# Altium footprint library 6-Connectors-2.PcbLib: 57 footprints (part 7 of 7)
Each footprint in its own frame and in the unit in brackets; x right, y up, seen from the top. Pads: shape width x height; smd on the part's side, far side on the other; paste and mask are expansions set on the pad; w line width, h text height; cw(c..) or ccw(c..) is an arc to the next point about the centre after c.
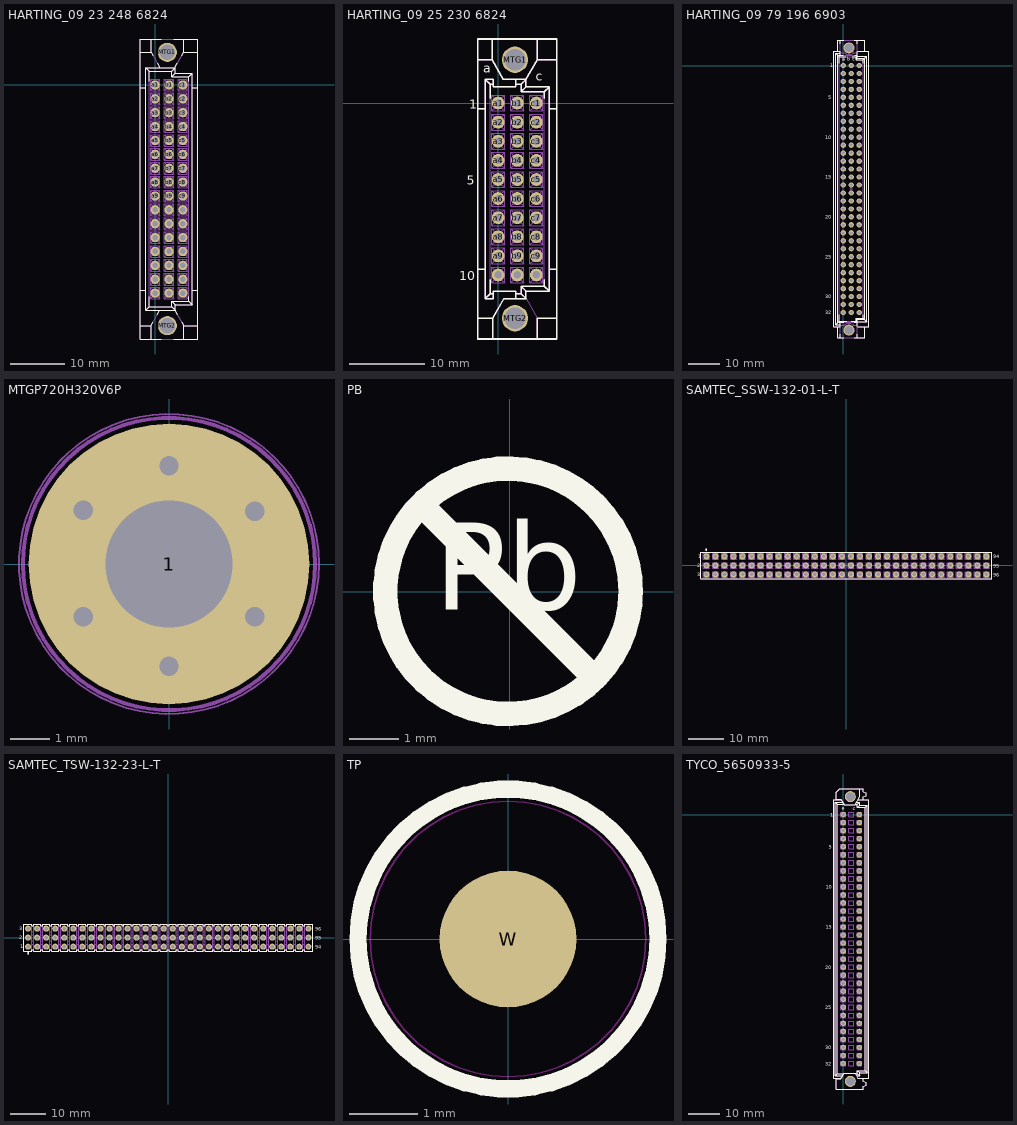
[diagram p6: the footprints below, top view; thin cyan lines are the x and y axes]

## HARTING_09 23 248 6824 [mm] "DIN 41612, Type 2C, Thru-Hole;  Rows a+b+c, 48 Position, Performance level 2, Lead 2.9 mm, Pitch 2.54mm, Vertical Female Connector"
height 11.6
pads (50):
  round 1.7 hole 1: a1(0,0) a2(0,-2.54) a3(0,-5.08) a4(0,-7.62) a5(0,-10.16) a6(0,-12.7) a7(0,-15.24) a8(0,-17.78) a9(0,-20.32) a10(0,-22.86) a11(0,-25.4) a12(0,-27.94) a13(0,-30.48) a14(0,-33.02) a15(0,-35.56) a16(0,-38.1) b1(2.54,0) b2(2.54,-2.54) b3(2.54,-5.08) b4(2.54,-7.62) b5(2.54,-10.16) b6(2.54,-12.7) b7(2.54,-15.24) b8(2.54,-17.78) b9(2.54,-20.32) b10(2.54,-22.86) b11(2.54,-25.4) b12(2.54,-27.94) b13(2.54,-30.48) b14(2.54,-33.02) b15(2.54,-35.56) b16(2.54,-38.1) c1(5.08,0) c2(5.08,-2.54) c3(5.08,-5.08) c4(5.08,-7.62) c5(5.08,-10.16) c6(5.08,-12.7) c7(5.08,-15.24) c8(5.08,-17.78) c9(5.08,-20.32) c10(5.08,-22.86) c11(5.08,-25.4) c12(5.08,-27.94) c13(5.08,-30.48) c14(5.08,-33.02) c15(5.08,-35.56) c16(5.08,-38.1)
  round 3.5 / inner round 3.5 / far side round 5.1 hole 2.8: MTG1(2.24,5.95) MTG2(2.24,-44.05)
Top Overlay:
  lines w0.2: -2.71,-44.05 -0.735,-44.05 ; -2.71,-37.55 -1.71,-37.55 ; -2.71,-0.55 -1.71,-0.55 ; -2.71,5.95 -0.735,5.95 ; -1.06,-38.763 -1.06,-40.6 ; -1.06,0.662 -1.06,2.5 ; -0.735,-46.5 -0.735,-44.05 ; -0.735,8.4 -0.735,5.95 ; -0.395,-43.461 -0.735,-44.05 ; -0.395,5.361 -0.735,5.95 ; 0.412,-42.063 0.882,-41.25 ; 0.412,3.962 0.882,3.15 ; 1.105,-46.5 -2.71,-46.5 -2.71,8.4 1.105,8.4 ; 3.375,-46.5 7.79,-46.5 7.79,8.4 3.375,8.4 ; 3.598,-41.25 4.068,-42.063 ; 3.598,3.15 4.068,3.962 ; 4.875,-43.461 5.215,-44.05 ; 4.875,5.361 5.215,5.95 ; 5.215,-46.5 5.215,-44.05 ; 5.215,8.4 5.215,5.95 ; 6.14,-38.763 6.14,-39.55 ; 6.14,0.662 6.14,1.45 ; 6.79,-37.55 7.79,-37.55 ; 6.79,-0.55 7.79,-0.55 ; 7.79,-44.05 5.215,-44.05 ; 7.79,5.95 5.215,5.95 ; -1.71,-41.25 -1.06,-40.6 ; -1.71,-41.25 3.69,-41.25 ; -1.71,-41.25 -1.71,3.15 ; -1.71,3.15 -1.06,2.5 ; -1.71,3.15 3.69,3.15 ; -1.06,-40.6 3.04,-40.6 ; -1.06,2.5 3.04,2.5 ; 3.04,-40.6 3.04,-39.55 ; 3.04,-40.6 3.69,-41.25 ; 3.04,-39.55 6.14,-39.55 ; 3.04,-39.55 3.69,-40.2 ; 3.04,1.45 3.04,2.5 ; 3.04,1.45 3.69,2.1 ; 3.04,1.45 6.14,1.45 ; 3.04,2.5 3.69,3.15 ; 3.69,-41.25 3.69,-40.2 ; 3.69,-40.2 6.79,-40.2 ; 3.69,2.1 6.79,2.1 ; 3.69,2.1 3.69,3.15 ; 6.14,-39.55 6.79,-40.2 ; 6.14,1.45 6.79,2.1 ; 6.79,-40.2 6.79,2.1
Mechanical 8:
  lines w0.1: -0.5,-38.1 0,-38.1 ; -0.5,0 0,0 ; 0,-38.6 0,-38.1 ; 0,-37.6 0,-38.1 ; 0,-0.5 0,0 ; 0,0.5 0,0 ; 0.5,-38.1 0,-38.1 ; 0.5,0 0,0 ; 1.74,-44.05 2.24,-44.05 ; 1.74,5.95 2.24,5.95 ; 2.04,-38.1 2.54,-38.1 ; 2.04,0 2.54,0 ; 2.24,-44.55 2.24,-44.05 ; 2.24,-43.55 2.24,-44.05 ; 2.24,5.45 2.24,5.95 ; 2.24,6.45 2.24,5.95 ; 2.54,-38.6 2.54,-38.1 ; 2.54,-37.6 2.54,-38.1 ; 2.54,-0.5 2.54,0 ; 2.54,0.5 2.54,0 ; 2.74,-44.05 2.24,-44.05 ; 2.74,5.95 2.24,5.95 ; 3.04,-38.1 2.54,-38.1 ; 3.04,0 2.54,0 ; 4.58,-38.1 5.08,-38.1 ; 4.58,0 5.08,0 ; 5.08,-38.6 5.08,-38.1 ; 5.08,-37.6 5.08,-38.1 ; 5.08,-0.5 5.08,0 ; 5.08,0.5 5.08,0 ; 5.58,-38.1 5.08,-38.1 ; 5.58,0 5.08,0
Mechanical 14:
  drawing of 670 lines, arcs and shapes, not listed
3D body "HARTING_09 23 248 6824.stp": height 11.6, standoff -4.5, extent -2.71,-46.5 7.79,8.4

## HARTING_09 25 230 6824 [mm] "DIN 41612, Type 3C, Thru-Hole;  Rows a+b+c, 30 Positions, Performance level 2, Lead 2.9 mm, Pitch 2.54mm, Vertical Female Connector"
height 11.6
pads (32):
  round 1.7 hole 1: a1(0,0) a2(0,-2.54) a3(0,-5.08) a4(0,-7.62) a5(0,-10.16) a6(0,-12.7) a7(0,-15.24) a8(0,-17.78) a9(0,-20.32) a10(0,-22.86) b1(2.54,0) b2(2.54,-2.54) b3(2.54,-5.08) b4(2.54,-7.62) b5(2.54,-10.16) b6(2.54,-12.7) b7(2.54,-15.24) b8(2.54,-17.78) b9(2.54,-20.32) b10(2.54,-22.86) c1(5.08,0) c2(5.08,-2.54) c3(5.08,-5.08) c4(5.08,-7.62) c5(5.08,-10.16) c6(5.08,-12.7) c7(5.08,-15.24) c8(5.08,-17.78) c9(5.08,-20.32) c10(5.08,-22.86)
  round 3.5 / inner round 3.5 / far side round 5.1 hole 2.8: MTG1(2.24,5.76) MTG2(2.24,-28.62)
Top Overlay:
  lines w0.2: -2.71,-28.62 -0.735,-28.62 ; -2.71,-22.12 -1.71,-22.12 ; -2.71,-0.74 -1.71,-0.74 ; -2.71,5.76 -0.81,5.76 ; -1.06,-23.523 -1.06,-25.355 ; -1.06,0.662 -1.06,2.495 ; -0.81,8.52 -0.81,5.76 ; -0.735,-31.38 -0.735,-28.62 ; -0.66,-25.355 -1.06,-25.355 ; -0.66,2.495 -1.06,2.495 ; 2.34,-26.005 2.34,-25.005 -0.66,-25.005 -0.66,-26.005 -1.71,-26.005 ; 2.34,-25.355 3.04,-25.355 ; 2.34,2.495 3.04,2.495 ; 2.34,3.145 2.34,2.145 -0.66,2.145 -0.66,3.145 -1.71,3.145 ; 3.705,-26.005 0.775,-26.005 -0.735,-28.62 ; 5.19,8.52 5.19,5.76 ; 5.215,-31.38 5.215,-28.62 7.79,-28.62 ; 6.14,-23.523 6.14,-24.355 ; 6.14,0.662 6.14,1.495 ; 6.79,-22.12 7.79,-22.12 ; 6.79,-0.74 7.79,-0.74 ; 7.79,5.76 5.19,5.76 ; -1.71,-26.005 -1.71,3.145 ; -1.71,-26.005 -1.06,-25.355 ; -1.71,3.145 -1.06,2.495 ; -0.81,5.76 0.7,3.145 3.69,3.145 ; 3.04,-25.355 3.04,-24.355 ; 3.04,-25.355 3.69,-26.005 3.69,-25.005 ; 3.04,-24.355 6.14,-24.355 ; 3.04,-24.355 3.69,-25.005 ; 3.04,1.495 3.04,2.495 ; 3.04,1.495 6.14,1.495 ; 3.04,1.495 3.69,2.145 ; 3.04,2.495 3.69,3.145 ; 3.69,-25.005 6.79,-25.005 ; 3.69,2.145 6.79,2.145 ; 3.69,2.145 3.69,3.145 ; 3.69,3.145 5.19,5.76 ; 6.14,-24.355 6.79,-25.005 ; 6.14,1.495 6.79,2.145 ; 6.79,-25.005 6.79,2.145 ; -2.71,-31.38 7.79,-31.38 7.79,8.52 -2.71,8.52 -2.71,-31.38
  text "c" at 4.975,2.95 h1.2
  text "10" at -5.172,-23.535 h1.2
  text "5" at -4.174,-10.885 h1.2
  text "1" at -3.839,-0.725 h1.2
  text "a" at -2,4 h1.2
Mechanical 8:
  lines w0.1: -0.5,-22.86 0,-22.86 ; -0.5,0 0,0 ; 0,-23.36 0,-22.86 ; 0,-22.36 0,-22.86 ; 0,-0.5 0,0 ; 0,0.5 0,0 ; 0.5,-22.86 0,-22.86 ; 0.5,0 0,0 ; 1.74,-28.62 2.24,-28.62 ; 1.74,5.76 2.24,5.76 ; 2.04,-22.86 2.54,-22.86 ; 2.04,0 2.54,0 ; 2.24,-29.12 2.24,-28.62 ; 2.24,-28.12 2.24,-28.62 ; 2.24,5.26 2.24,5.76 ; 2.24,6.26 2.24,5.76 ; 2.54,-23.36 2.54,-22.86 ; 2.54,-22.36 2.54,-22.86 ; 2.54,-0.5 2.54,0 ; 2.54,0.5 2.54,0 ; 2.74,-28.62 2.24,-28.62 ; 2.74,5.76 2.24,5.76 ; 3.04,-22.86 2.54,-22.86 ; 3.04,0 2.54,0 ; 4.58,-22.86 5.08,-22.86 ; 4.58,0 5.08,0 ; 5.08,-23.36 5.08,-22.86 ; 5.08,-22.36 5.08,-22.86 ; 5.08,-0.5 5.08,0 ; 5.08,0.5 5.08,0 ; 5.58,-22.86 5.08,-22.86 ; 5.58,0 5.08,0
Mechanical 14:
  drawing of 422 lines, arcs and shapes, not listed
  text "c" at 4.975,2.95 h1.2
  text "a" at -2,4 h1.2
  text "10" at -5.172,-23.535 h1.2
  text "1" at -3.839,-0.725 h1.2
  text "5" at -4.174,-10.885 h1.2
3D body "HARTING_09 25 230 6824.stp": height 11.6, standoff -2.9, extent -2.71,-31.38 7.79,8.52

## HARTING_09 79 196 6903 [mm] "DIN 41612, Type RL, 96 Position, Rows a+b+c, Performance level 2, Straight Male Connector, Lead 4.0 mm, Pitch 2.54mm"
height 11.6
pads (98):
  round 1.7 hole 1: a1(0,0) a2(0,-2.54) a3(0,-5.08) a4(0,-7.62) a5(0,-10.16) a6(0,-12.7) a7(0,-15.24) a8(0,-17.78) a9(0,-20.32) a10(0,-22.86) a11(0,-25.4) a12(0,-27.94) a13(0,-30.48) a14(0,-33.02) a15(0,-35.56) a16(0,-38.1) a17(0,-40.64) a18(0,-43.18) a19(0,-45.72) a20(0,-48.26) a21(0,-50.8) a22(0,-53.34) a23(0,-55.88) a24(0,-58.42) a25(0,-60.96) a26(0,-63.5) a27(0,-66.04) a28(0,-68.58) a29(0,-71.12) a30(0,-73.66) a31(0,-76.2) a32(0,-78.74) b1(2.54,0) b2(2.54,-2.54) b3(2.54,-5.08) b4(2.54,-7.62) b5(2.54,-10.16) b6(2.54,-12.7) b7(2.54,-15.24) b8(2.54,-17.78) b9(2.54,-20.32) b10(2.54,-22.86) b11(2.54,-25.4) b12(2.54,-27.94) b13(2.54,-30.48) b14(2.54,-33.02) b15(2.54,-35.56) b16(2.54,-38.1) b17(2.54,-40.64) b18(2.54,-43.18) b19(2.54,-45.72) b20(2.54,-48.26) b21(2.54,-50.8) b22(2.54,-53.34) b23(2.54,-55.88) b24(2.54,-58.42) b25(2.54,-60.96) b26(2.54,-63.5) b27(2.54,-66.04) b28(2.54,-68.58) b29(2.54,-71.12) b30(2.54,-73.66) b31(2.54,-76.2) b32(2.54,-78.74) c1(5.08,0) c2(5.08,-2.54) c3(5.08,-5.08) c4(5.08,-7.62) c5(5.08,-10.16) c6(5.08,-12.7) c7(5.08,-15.24) c8(5.08,-17.78) c9(5.08,-20.32) c10(5.08,-22.86) c11(5.08,-25.4) c12(5.08,-27.94) c13(5.08,-30.48) c14(5.08,-33.02) c15(5.08,-35.56) c16(5.08,-38.1) c17(5.08,-40.64) c18(5.08,-43.18) c19(5.08,-45.72) c20(5.08,-48.26) c21(5.08,-50.8) c22(5.08,-53.34) c23(5.08,-55.88) c24(5.08,-58.42) c25(5.08,-60.96) c26(5.08,-63.5) c27(5.08,-66.04) c28(5.08,-68.58) c29(5.08,-71.12) c30(5.08,-73.66) c31(5.08,-76.2) c32(5.08,-78.74)
  round 3.5 / inner round 3.5 / far side round 5.1 hole 2.8: MTG1(1.81,5.63) MTG2(1.81,-84.37)
Top Overlay:
  lines w0.2: -1.835,-83.32 -1.835,-86.87 0.152,-86.87 ; -1.835,4.58 -1.835,8.13 0.152,8.13 ; -1.36,-79.484 -1.36,-81.47 ; -1.36,0.744 -1.36,2.83 ; -1,-83.32 -3.01,-83.32 -3.01,4.58 -1,4.58 ; -0.89,-86.87 -0.89,-85.678 ; -0.89,-83.062 -0.89,-81.92 ; -0.89,-82.57 -2.46,-82.57 ; -0.89,3.28 -0.89,4.322 ; -0.89,3.93 -2.46,3.93 ; -0.89,6.938 -0.89,8.13 ; -0.055,3.28 -1.81,3.28 -1.81,-81.92 0.079,-81.92 ; 0.733,2.83 -1.36,2.83 ; 1.042,-81.47 -1.36,-81.47 ; 2.578,-81.47 4.06,-81.47 ; 2.887,2.83 4.06,2.83 ; 3.468,-86.87 6.915,-86.87 6.915,-83.32 ; 3.468,8.13 6.915,8.13 6.915,4.58 ; 3.541,-81.92 4.51,-81.92 4.06,-81.47 ; 3.675,3.28 4.51,3.28 4.06,2.83 ; 4.51,-86.87 4.51,-85.678 ; 4.51,-83.062 4.51,-80.97 ; 4.51,-81.62 7.54,-81.62 ; 4.51,2.98 7.54,2.98 ; 4.51,4.322 4.51,2.33 ; 4.51,6.938 4.51,8.13 ; 4.62,-83.32 8.09,-83.32 8.09,4.58 4.62,4.58 ; 6.44,-79.484 6.44,-80.52 ; 6.44,0.744 6.44,1.88 ; -2.46,-82.57 -2.46,3.93 ; -2.46,-82.57 -1.36,-81.47 ; -2.46,3.93 -1.36,2.83 ; 4.06,-81.47 4.06,-80.52 ; 4.06,-80.52 6.44,-80.52 ; 4.06,-80.52 4.51,-80.97 ; 4.06,1.88 4.06,2.83 ; 4.06,1.88 6.44,1.88 ; 4.06,1.88 4.51,2.33 ; 4.51,-80.97 6.89,-80.97 6.89,2.33 4.51,2.33 ; 6.44,-80.52 7.54,-81.62 ; 6.44,1.88 7.54,2.98 ; 7.54,-81.62 7.54,2.98
  text "32" at -5.715,-79.34 h1.2
  text "30" at -5.715,-74.26 h1.2
  text "25" at -5.715,-61.56 h1.2
  text "20" at -5.715,-48.86 h1.2
  text "15" at -5.715,-36.16 h1.2
  text "10" at -5.715,-23.46 h1.2
  text "c" at 2.857,1.587 h1.2
  text "b" at 1.27,1.587 h1.2
  text "a" at -0.318,1.587 h1.2
  text "5" at -4.763,-10.76 h1.2
  text "1" at -4.127,-0.6 h1.2
Mechanical 8:
  drawing of 400 lines, arcs and shapes, not listed
Mechanical 14:
  circle w0.1: c1.81,5.63 r1.4
  circle w0.1: c1.81,-84.37 r1.4
  lines w0.1: -1.835,-83.32 -1.835,-86.87 6.915,-86.87 6.915,-83.32 ; -1.835,4.58 -1.835,8.13 6.915,8.13 6.915,4.58 ; -0.89,-86.87 -0.89,-81.92 ; -0.89,-83.32 -3.01,-83.32 -3.01,4.58 -0.89,4.58 ; -0.89,-82.82 0.288,-82.82 cw(c1.81,-84.74) 3.332,-82.82 4.51,-82.82 ; -0.89,-82.57 -2.46,-82.57 ; -0.89,3.28 -0.89,8.13 ; -0.89,3.93 -2.46,3.93 ; -0.89,4.08 0.288,4.08 ccw(c1.81,6) 3.332,4.08 4.51,4.08 ; 4.51,-86.87 4.51,-80.97 ; 4.51,-83.32 8.09,-83.32 8.09,4.58 4.51,4.58 ; 4.51,-81.62 7.54,-81.62 ; 4.51,2.98 7.54,2.98 ; 4.51,8.13 4.51,2.33 ; -2.46,-82.57 -2.46,3.93 ; -2.46,-82.57 -1.36,-81.47 ; -2.46,3.93 -1.36,2.83 ; -1.36,-81.47 4.06,-81.47 ; -1.36,-81.47 -1.36,2.83 ; -1.36,2.83 4.06,2.83 ; 4.06,-81.47 4.06,-80.52 ; 4.06,-81.47 4.51,-81.92 -1.81,-81.92 -1.81,3.28 4.51,3.28 4.06,2.83 ; 4.06,-80.52 6.44,-80.52 ; 4.06,-80.52 4.51,-80.97 ; 4.06,1.88 4.06,2.83 ; 4.06,1.88 6.44,1.88 ; 4.06,1.88 4.51,2.33 ; 4.51,-80.97 6.89,-80.97 6.89,2.33 4.51,2.33 ; 6.44,-80.52 6.44,1.88 ; 6.44,-80.52 7.54,-81.62 ; 6.44,1.88 7.54,2.98 ; 7.54,-81.62 7.54,2.98
  text "1" at -4.127,-0.6 h1.2
  text "5" at -4.763,-10.76 h1.2
  text "a" at -0.318,1.587 h1.2
  text "b" at 1.27,1.587 h1.2
  text "c" at 2.857,1.587 h1.2
  text "10" at -5.715,-23.46 h1.2
  text "15" at -5.715,-36.16 h1.2
  text "20" at -5.715,-48.86 h1.2
  text "25" at -5.715,-61.56 h1.2
  text "30" at -5.715,-74.26 h1.2
  text "32" at -5.715,-79.34 h1.2
3D body "HARTING_09 79 196 6903.stp": height 11.6, standoff -2.5, extent -3.01,-86.87 8.09,8.13

## MTGP720H320V6P [mm]
pads (1):
  round 7.2 hole 3.25: 1(0,0)
via -2.2,-1.35 diameter 1 hole 0.5
via -2.2,1.375 diameter 1 hole 0.5
via 0,2.525 diameter 1 hole 0.5
via 2.2,1.35 diameter 1 hole 0.5
via 0,-2.625 diameter 1 hole 0.5
via 2.2,-1.35 diameter 1 hole 0.5
Mechanical 8:
  circle w0.1: c0,0 r2.6
  circle w0.1: c0,0 r3.75
  lines w0.1: -2.657,1.625 -2.224,1.375 ; -2.632,-1.6 -2.199,-1.35 ; -2.474,0.942 -2.224,1.375 ; -2.449,-0.917 -2.199,-1.35 ; -1.974,1.808 -2.224,1.375 ; -1.949,-1.783 -2.199,-1.35 ; -1.791,1.125 -2.224,1.375 ; -1.766,-1.1 -2.199,-1.35 ; -0.5,-2.625 0,-2.625 ; -0.5,0 0,0 ; -0.5,2.525 0,2.525 ; 0,-3.125 0,-2.625 ; 0,-2.125 0,-2.625 ; 0,-0.5 0,0 ; 0,0.5 0,0 ; 0,2.025 0,2.525 ; 0,3.025 0,2.525 ; 0.5,-2.625 0,-2.625 ; 0.5,0 0,0 ; 0.5,2.525 0,2.525 ; 1.766,-1.1 2.199,-1.35 ; 1.766,1.1 2.199,1.35 ; 1.949,-1.783 2.199,-1.35 ; 1.949,1.783 2.199,1.35 ; 2.449,-0.917 2.199,-1.35 ; 2.449,0.917 2.199,1.35 ; 2.632,-1.6 2.199,-1.35 ; 2.632,1.6 2.199,1.35
Mechanical 14:
  circle w0.1: c0,0 r3.75
Mechanical 15:
  circle w0.05: c0,0 r3.85
3D body "mtgp720h320v6p.stp": height 0.1, standoff -1.75, extent -3.627,-3.627 3.628,3.628

## PB [mm]
Top Overlay:
  circle w0.5: c-0.031,0.013 r2.5
  lines w0.5: -1.737,1.719 1.675,-1.693
  text "Pb" at -1.536,-0.948 h3.05
3D body "pb.stp": height 0.02, standoff 0, extent -2.725,-2.725 2.725,2.725

## SAMTEC_SSW-132-01-L-T [mm] "96 Contacts - Pitch 2.54mm - Triple Row Through Mount Straigh Socket (Lead Length 2.64mm)"
height 8.51
pads (96):
  round 1.7 hole 1: 1(-39.37,2.54) 2(-39.37,0) 3(-39.37,-2.54) 4(-36.83,2.54) 5(-36.83,0) 6(-36.83,-2.54) 7(-34.29,2.54) 8(-34.29,0) 9(-34.29,-2.54) 10(-31.75,2.54) 11(-31.75,0) 12(-31.75,-2.54) 13(-29.21,2.54) 14(-29.21,0) 15(-29.21,-2.54) 16(-26.67,2.54) 17(-26.67,0) 18(-26.67,-2.54) 19(-24.13,2.54) 20(-24.13,0) 21(-24.13,-2.54) 22(-21.59,2.54) 23(-21.59,0) 24(-21.59,-2.54) 25(-19.05,2.54) 26(-19.05,0) 27(-19.05,-2.54) 28(-16.51,2.54) 29(-16.51,0) 30(-16.51,-2.54) 31(-13.97,2.54) 32(-13.97,0) 33(-13.97,-2.54) 34(-11.43,2.54) 35(-11.43,0) 36(-11.43,-2.54) 37(-8.89,2.54) 38(-8.89,0) 39(-8.89,-2.54) 40(-6.35,2.54) 41(-6.35,0) 42(-6.35,-2.54) 43(-3.81,2.54) 44(-3.81,0) 45(-3.81,-2.54) 46(-1.27,2.54) 47(-1.27,0) 48(-1.27,-2.54) 49(1.27,2.54) 50(1.27,0) 51(1.27,-2.54) 52(3.81,2.54) 53(3.81,0) 54(3.81,-2.54) 55(6.35,2.54) 56(6.35,0) 57(6.35,-2.54) 58(8.89,2.54) 59(8.89,0) 60(8.89,-2.54) 61(11.43,2.54) 62(11.43,0) 63(11.43,-2.54) 64(13.97,2.54) 65(13.97,0) 66(13.97,-2.54) 67(16.51,2.54) 68(16.51,0) 69(16.51,-2.54) 70(19.05,2.54) 71(19.05,0) 72(19.05,-2.54) 73(21.59,2.54) 74(21.59,0) 75(21.59,-2.54) 76(24.13,2.54) 77(24.13,0) 78(24.13,-2.54) 79(26.67,2.54) 80(26.67,0) 81(26.67,-2.54) 82(29.21,2.54) 83(29.21,0) 84(29.21,-2.54) 85(31.75,2.54) 86(31.75,0) 87(31.75,-2.54) 88(34.29,2.54) 89(34.29,0) 90(34.29,-2.54) 91(36.83,2.54) 92(36.83,0) 93(36.83,-2.54) 94(39.37,2.54) 95(39.37,0) 96(39.37,-2.54)
Top Overlay:
  circle w0.3: c-39.405,4.405 r0.15
  lines w0.2: -40.894,-3.747 40.894,-3.747 40.894,3.747 -40.894,3.747 -40.894,-3.747
  text "1" at -41.717,2.042 h1
  text "96" at 41.34,-3.12 h1
  text "2" at -42.017,-0.498 h1
  text "3" at -42.017,-3.038 h1
  text "95" at 41.34,-0.58 h1
  text "94" at 41.34,1.96 h1
Mechanical 8:
  drawing of 388 lines, arcs and shapes, not listed
Mechanical 14:
  drawing of 1157 lines, arcs and shapes, not listed
  text "1" at -41.717,2.042 h1
  text "96" at 41.34,-3.12 h1
  text "2" at -42.017,-0.498 h1
  text "3" at -42.017,-3.038 h1
  text "95" at 41.34,-0.58 h1
  text "94" at 41.34,1.96 h1
3D body "SAMTEC_SSW-132-01-L-T.stp": height 8.51, standoff -2.54, extent -40.894,-3.746 40.894,3.747

## SAMTEC_TSW-132-23-L-T [mm] "96 Contacts - Pitch 2.54mm - Triple Row Through Mount Straigh Header (Lead Length 2.92mm)"
height 11.3
pads (96):
  round 1.7 hole 1: 1(-39.37,-2.54) 2(-39.37,0) 3(-39.37,2.54) 4(-36.83,-2.54) 5(-36.83,0) 6(-36.83,2.54) 7(-34.29,-2.54) 8(-34.29,0) 9(-34.29,2.54) 10(-31.75,-2.54) 11(-31.75,0) 12(-31.75,2.54) 13(-29.21,-2.54) 14(-29.21,0) 15(-29.21,2.54) 16(-26.67,-2.54) 17(-26.67,0) 18(-26.67,2.54) 19(-24.13,-2.54) 20(-24.13,0) 21(-24.13,2.54) 22(-21.59,-2.54) 23(-21.59,0) 24(-21.59,2.54) 25(-19.05,-2.54) 26(-19.05,0) 27(-19.05,2.54) 28(-16.51,-2.54) 29(-16.51,0) 30(-16.51,2.54) 31(-13.97,-2.54) 32(-13.97,0) 33(-13.97,2.54) 34(-11.43,-2.54) 35(-11.43,0) 36(-11.43,2.54) 37(-8.89,-2.54) 38(-8.89,0) 39(-8.89,2.54) 40(-6.35,-2.54) 41(-6.35,0) 42(-6.35,2.54) 43(-3.81,-2.54) 44(-3.81,0) 45(-3.81,2.54) 46(-1.27,-2.54) 47(-1.27,0) 48(-1.27,2.54) 49(1.27,-2.54) 50(1.27,0) 51(1.27,2.54) 52(3.81,-2.54) 53(3.81,0) 54(3.81,2.54) 55(6.35,-2.54) 56(6.35,0) 57(6.35,2.54) 58(8.89,-2.54) 59(8.89,0) 60(8.89,2.54) 61(11.43,-2.54) 62(11.43,0) 63(11.43,2.54) 64(13.97,-2.54) 65(13.97,0) 66(13.97,2.54) 67(16.51,-2.54) 68(16.51,0) 69(16.51,2.54) 70(19.05,-2.54) 71(19.05,0) 72(19.05,2.54) 73(21.59,-2.54) 74(21.59,0) 75(21.59,2.54) 76(24.13,-2.54) 77(24.13,0) 78(24.13,2.54) 79(26.67,-2.54) 80(26.67,0) 81(26.67,2.54) 82(29.21,-2.54) 83(29.21,0) 84(29.21,2.54) 85(31.75,-2.54) 86(31.75,0) 87(31.75,2.54) 88(34.29,-2.54) 89(34.29,0) 90(34.29,2.54) 91(36.83,-2.54) 92(36.83,0) 93(36.83,2.54) 94(39.37,-2.54) 95(39.37,0) 96(39.37,2.54)
Top Overlay:
  drawing of 253 lines, arcs and shapes, not listed
  text "3" at -41.917,2.042 h1
  text "94" at 41.34,-3.12 h1
  text "2" at -41.917,-0.498 h1
  text "1" at -41.617,-3.038 h1
  text "95" at 41.34,-0.58 h1
  text "96" at 41.34,1.96 h1
Mechanical 8:
  lines w0.1: -39.87,-2.54 -39.37,-2.54 ; -39.87,0 -39.37,0 ; -39.87,2.54 -39.37,2.54 ; -39.37,-3.04 -39.37,-2.54 ; -39.37,-2.04 -39.37,-2.54 ; -39.37,-0.5 -39.37,0 ; -39.37,0.5 -39.37,0 ; -39.37,2.04 -39.37,2.54 ; -39.37,3.04 -39.37,2.54 ; -38.87,-2.54 -39.37,-2.54 ; -38.87,0 -39.37,0 ; -38.87,2.54 -39.37,2.54 ; -0.5,0 0,0 ; 0,-0.5 0,0 ; 0,0.5 0,0 ; 0.5,0 0,0 ; 38.87,-2.54 39.37,-2.54 ; 38.87,0 39.37,0 ; 38.87,2.54 39.37,2.54 ; 39.37,-3.04 39.37,-2.54 ; 39.37,-2.04 39.37,-2.54 ; 39.37,-0.5 39.37,0 ; 39.37,0.5 39.37,0 ; 39.37,2.04 39.37,2.54 ; 39.37,3.04 39.37,2.54 ; 39.87,-2.54 39.37,-2.54 ; 39.87,0 39.37,0 ; 39.87,2.54 39.37,2.54
Mechanical 14:
  drawing of 699 lines, arcs and shapes, not listed
  text "3" at -41.917,2.042 h1
  text "94" at 41.34,-3.12 h1
  text "2" at -41.917,-0.498 h1
  text "1" at -41.617,-3.038 h1
  text "95" at 41.34,-0.58 h1
  text "96" at 41.34,1.96 h1
3D body "SAMTEC_TSW-132-23-L-T.stp": height 8.38, standoff -2.92, extent -40.64,-3.81 40.64,3.81

## TP [mm]
height 11.7
pads (1):
  round 2 smd mask+1: W(0,0)
Top Overlay:
  circle w0.254: c0,0 r2.195
Keep-Out Layer:
  circle w0.025: c0,0 r2.017
3D body "1_016-1_016-3_tp.stp": height 0.02, standoff 0, extent -1.5,-1.5 1.5,1.5

## TYCO_5650933-5 [mm] "DIN 41612, Type C,  Thru-Hole; Rows a+c, 64 Position, Performance level 2, Lead 3mm, Pitch 2.54mm, Straight Male Connector"
height 11.51
pads (66):
  round 1.7 hole 1: a1(0,0) a2(0,-2.54) a3(0,-5.08) a4(0,-7.62) a5(0,-10.16) a6(0,-12.7) a7(0,-15.24) a8(0,-17.78) a9(0,-20.32) a10(0,-22.86) a11(0,-25.4) a12(0,-27.94) a13(0,-30.48) a14(0,-33.02) a15(0,-35.56) a16(0,-38.1) a17(0,-40.64) a18(0,-43.18) a19(0,-45.72) a20(0,-48.26) a21(0,-50.8) a22(0,-53.34) a23(0,-55.88) a24(0,-58.42) a25(0,-60.96) a26(0,-63.5) a27(0,-66.04) a28(0,-68.58) a29(0,-71.12) a30(0,-73.66) a31(0,-76.2) a32(0,-78.74) c1(5.08,0) c2(5.08,-2.54) c3(5.08,-5.08) c4(5.08,-7.62) c5(5.08,-10.16) c6(5.08,-12.7) c7(5.08,-15.24) c8(5.08,-17.78) c9(5.08,-20.32) c10(5.08,-22.86) c11(5.08,-25.4) c12(5.08,-27.94) c13(5.08,-30.48) c14(5.08,-33.02) c15(5.08,-35.56) c16(5.08,-38.1) c17(5.08,-40.64) c18(5.08,-43.18) c19(5.08,-45.72) c20(5.08,-48.26) c21(5.08,-50.8) c22(5.08,-53.34) c23(5.08,-55.88) c24(5.08,-58.42) c25(5.08,-60.96) c26(5.08,-63.5) c27(5.08,-66.04) c28(5.08,-68.58) c29(5.08,-71.12) c30(5.08,-73.66) c31(5.08,-76.2) c32(5.08,-78.74)
  round 3.5 / inner round 3.5 / far side round 5.1 hole 2.8: MTG1(2.24,5.64) MTG2(2.24,-84.36)
Top Overlay:
  lines w0.2: -2.195,-83.612 -0.735,-83.612 0.3,-81.82 3.73,-81.82 4.645,-83.405 8.04,-83.405 8.04,4.685 4.645,4.685 ; -2.195,-83.405 -2.195,-86.795 6.285,-86.795 6.285,-85.905 7.275,-85.545 7.275,-84.655 6.285,-84.294 6.285,-83.405 ; -2.195,4.685 -2.195,7.055 -1.175,8.075 6.285,8.075 6.285,7.185 7.275,6.825 7.275,5.935 6.285,5.575 6.285,4.685 ; -2.195,4.892 -0.735,4.892 0.3,3.1 3.73,3.1 5.197,5.64 5.197,8.075 ; -0.615,-83.405 -2.96,-83.405 -2.96,4.685 -0.615,4.685 ; -0.188,-82.665 -2.49,-82.665 ; -0.188,3.945 -2.49,3.945 ; 0.193,-82.005 -1.83,-82.005 ; 0.193,3.285 -1.83,3.285 ; 3.837,-82.005 4.5,-82.005 ; 3.837,3.285 4.5,3.285 ; 4.218,-82.665 5.16,-82.665 ; 4.218,3.945 5.16,3.945 ; -2.49,-82.665 -2.49,3.945 ; -2.49,-82.665 -1.83,-82.005 ; -2.49,3.945 -1.83,3.285 ; -1.83,-82.005 -1.83,3.285 ; 4.5,-82.005 4.5,-81.065 ; 4.5,-82.005 5.16,-82.665 ; 4.5,-81.065 5.16,-81.725 ; 4.5,-81.065 6.91,-81.065 ; 4.5,2.345 6.91,2.345 ; 4.5,2.345 5.16,3.005 ; 4.5,2.345 4.5,3.285 ; 4.5,3.285 5.16,3.945 ; 5.16,-82.665 5.16,-81.725 ; 5.16,-81.725 7.57,-81.725 ; 5.16,3.005 7.57,3.005 ; 5.16,3.005 5.16,3.945 ; 6.91,-81.065 6.91,2.345 ; 6.91,-81.065 7.57,-81.725 ; 6.91,2.345 7.57,3.005 ; 7.57,-81.725 7.57,3.005
  text "10" at -5.475,-23.46 h1.2
  text "c" at 2.995,1.37 h1.2
  text "a" at -0.4,1.445 h1.2
  text "32" at -5.675,-79.365 h1.2
  text "5" at -4.55,-10.835 h1.2
  text "30" at -5.675,-74.285 h1.2
  text "25" at -5.675,-61.585 h1.2
  text "20" at -5.675,-48.885 h1.2
  text "15" at -5.475,-36.135 h1.2
  text "1" at -4.075,-0.675 h1.2
Mechanical 8:
  drawing of 264 lines, arcs and shapes, not listed
Mechanical 14:
  drawing of 700 lines, arcs and shapes, not listed
  text "10" at -5.475,-23.46 h1.2
  text "32" at -5.675,-79.365 h1.2
  text "5" at -4.55,-10.835 h1.2
  text "30" at -5.675,-74.285 h1.2
  text "25" at -5.675,-61.585 h1.2
  text "20" at -5.675,-48.885 h1.2
  text "15" at -5.475,-36.135 h1.2
  text "1" at -4.075,-0.675 h1.2
  text "a" at -0.4,1.445 h1.2
  text "c" at -1.445,5.06 h1.2
3D body "TYCO_5650933-5.stp": height 11.51, standoff -3.3, extent -2.96,-86.795 8.04,8.075